# Altium schematic symbol library 13-Analog D 数模模数.SchLib: 573 symbols (part 2 of 6)
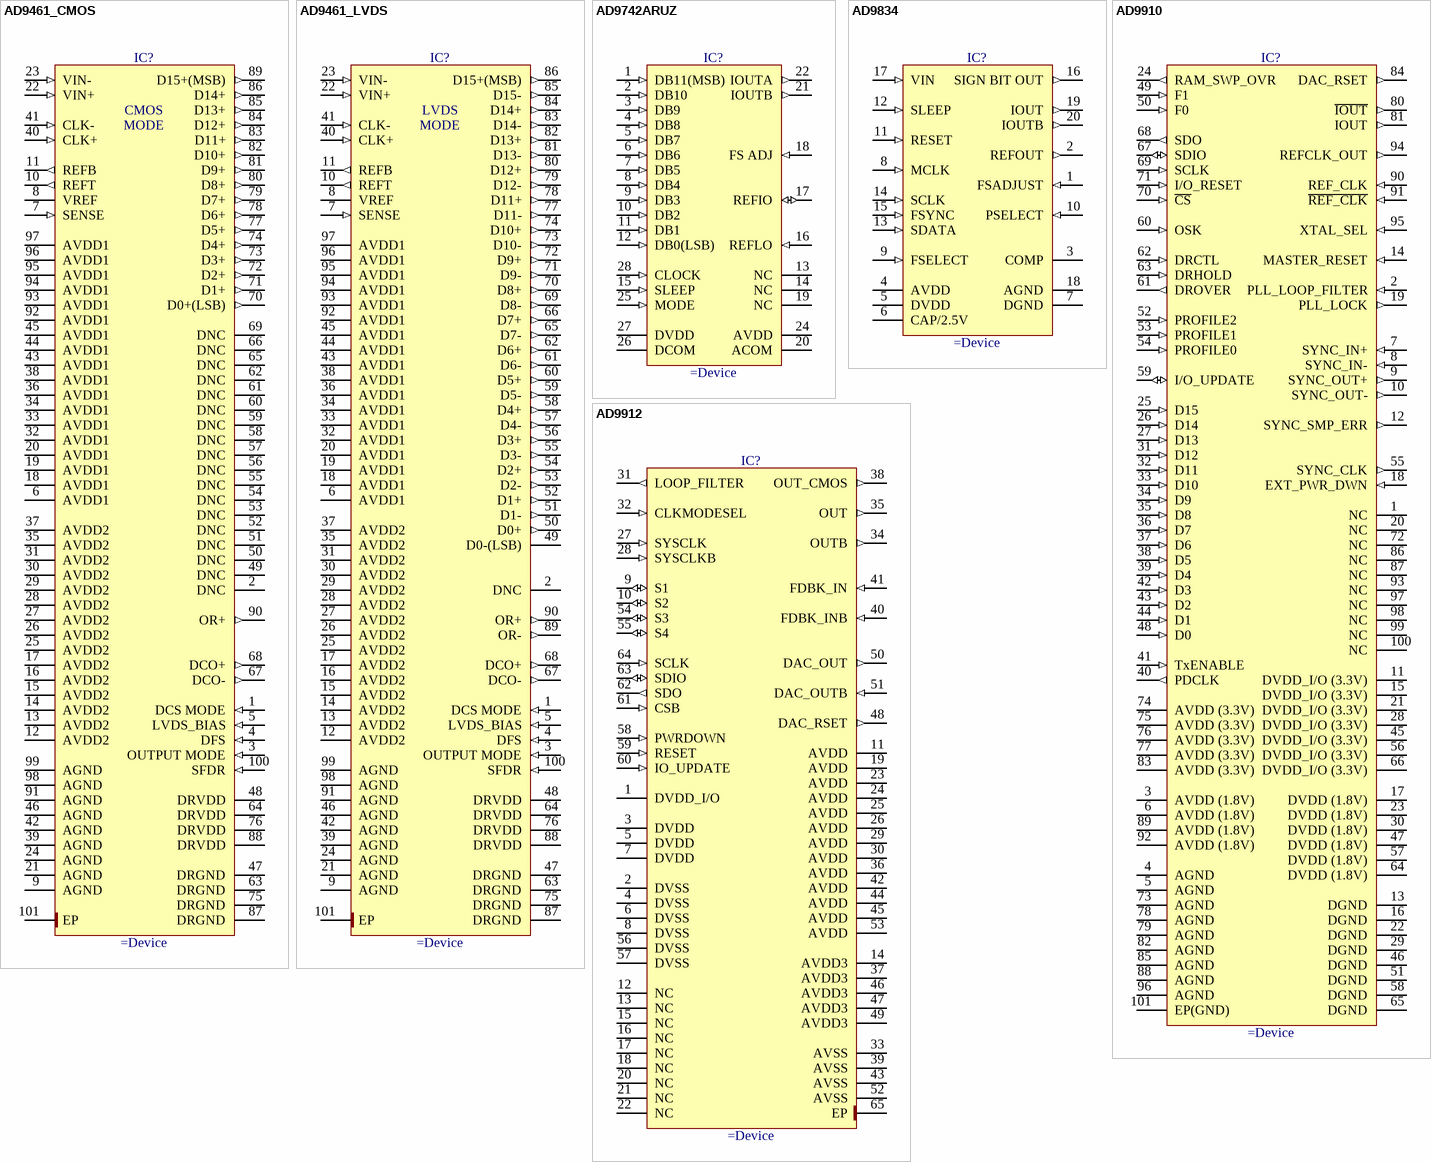
[diagram p41: symbols AD9461_CMOS to AD9912]

## AD9461_LVDS
designator IC?
16-Bit, 130 MSPS IF Sampling ADC (LVDS Mode)
pins: 1 DCS MODE (in), 2 DNC, 3 OUTPUT MODE (in), 4 DFS (in), 5 LVDS_BIAS (in), 6 AVDD1 (power), 7 SENSE (in), 8 VREF, 9 AGND (power), 10 REFT (out), 11 REFB (out), 12 AVDD2 (power), 13 AVDD2 (power), 14 AVDD2 (power), 15 AVDD2 (power), 16 AVDD2 (power), 17 AVDD2 (power), 18 AVDD1 (power), 19 AVDD1 (power), 20 AVDD1 (power), 21 AGND (power), 22 VIN+ (in), 23 VIN- (in), 24 AGND (power), 25 AVDD2 (power), 26 AVDD2 (power), 27 AVDD2 (power), 28 AVDD2 (power), 29 AVDD2 (power), 30 AVDD2 (power), 31 AVDD2 (power), 32 AVDD1 (power), 33 AVDD1 (power), 34 AVDD1 (power), 35 AVDD2 (power), 36 AVDD1 (power), 37 AVDD2 (power), 38 AVDD1 (power), 39 AGND (power), 40 CLK+ (in), 41 CLK- (in), 42 AGND (power), 43 AVDD1 (power), 44 AVDD1 (power), 45 AVDD1 (power), 46 AGND (power), 47 DRGND (power), 48 DRVDD (power), 49 D0-(LSB) (power), 50 D0+ (out), 51 D1- (out), 52 D1+ (out), 53 D2- (out), 54 D2+ (out), 55 D3- (out), 56 D3+ (out), 57 D4- (out), 58 D4+ (out), 59 D5- (out), 60 D5+ (out), 61 D6- (out), 62 D6+ (out), 63 DRGND (power), 64 DRVDD (power), 65 D7- (out), 66 D7+ (out), 67 DCO- (out), 68 DCO+ (out), 69 D8- (out), 70 D8+ (out), 71 D9- (out), 72 D9+ (out), 73 D10- (out), 74 D10+ (out), 75 DRGND (power), 76 DRVDD (power), 77 D11- (out), 78 D11+ (out), 79 D12- (out), 80 D12+ (out), 81 D13- (out), 82 D13+ (out), 83 D14- (out), 84 D14+ (out), 85 D15- (out), 86 D15+(MSB) (out), 87 DRGND (power), 88 DRVDD (power), 89 OR- (out), 90 OR+ (out), 91 AGND (power), 92 AVDD1 (power), 93 AVDD1 (power), 94 AVDD1 (power), 95 AVDD1 (power), 96 AVDD1 (power), 97 AVDD1 (power), 98 AGND (power), 99 AGND (power), 100 SFDR (in), 101 EP (power)
text: LVDS; MODE

## AD9742ARUZ
designator IC?
12-Bit, 210 MSPS TxDAC® D/A Converter
pins: 1 DB11(MSB) (in), 2 DB10 (in), 3 DB9 (in), 4 DB8 (in), 5 DB7 (in), 6 DB6 (in), 7 DB5 (in), 8 DB4 (in), 9 DB3 (in), 10 DB2 (in), 11 DB1 (in), 12 DB0(LSB) (in), 13 NC, 14 NC, 15 SLEEP (in), 16 REFLO (in), 17 REFIO (io), 18 FS ADJ (in), 19 NC, 20 ACOM (power), 21 IOUTB (out), 22 IOUTA (out), 24 AVDD (power), 25 MODE (in), 26 DCOM (power), 27 DVDD (power), 28 CLOCK (in)

## AD9834
designator IC?
20mW Power, 2.3V to 5.5V, 75MHz Complete DDS
pins: 1 FSADJUST (in) "Full-Scale Adjust Control. A resistor (RSET) is connected between this pin and AGND. This determines the magnitude of the full-scale DAC current. [see datasheet]", 2 REFOUT (out) "Voltage Reference Output. The AD9834 has an internal 1.20 V reference that is made available at this pin.", 3 COMP "DAC Bias Pin. This pin is used for decoupling the DAC bias voltage.", 4 AVDD (power) "Positive Power Supply for the Analog Section. AVDD can have a value from 2.3 V to 5.5 V. A 0.1 uF decoupling capacitor should be connected between AVDD and AGND.", 5 DVDD (power) "Positive Power Supply for the Digital Section. DVDD can have a value from 2.3 V to 5.5 V. A 0.1 uF decoupling capacitor should be connected between DVDD and DGND.", 6 CAP/2.5V (power) "The digital circuitry operates from a 2.5 V power supply. This 2.5 V is generated from DVDD using an on-board regulator (when DVDD exceeds 2.7 V). [see datasheet]", 7 DGND (power) "Digital Ground.", 8 MCLK (in) "Digital Clock Input. DDS output frequencies are expressed as a binary fraction of the frequency of MCLK. The output frequency accuracy and phase noise are determined by this clock.", 9 FSELECT (in) "Frequency Select Input. FSELECT controls which frequency register, FREQ0 or FREQ1, is used in the phase accumulator. The frequency register to be used can be selected using Pin FSELECT or Bit FSEL. [see datasheet]", 10 PSELECT (in) "Phase Select Input. PSELECT controls which phase register, PHASE0 or PHASE1, is added to the phase accumulator output. The phase register to be used can be selected using Pin PSELECT or Bit PSEL. [see datasheet]", 11 RESET (in) "Active High Digital Input. RESET resets appropriate internal registers to zero; this corresponds to an analog output of midscale. RESET does not affect any of the addressable registers.", 12 SLEEP (in) "Active High Digital Input. When this pin is high, the DAC is powered down. This pin has the same function as Control Bit SLEEP12.", 13 SDATA (in) "Serial Data Input. The 16-bit serial data-word is applied to this input.", 14 SCLK (in) "Serial Clock Input. Data is clocked into the AD9834 on each falling SCLK edge.", 15 FSYNC (in) "Active Low Control Input. This is the frame synchronization signal for the input data. When FSYNC is taken low, the internal logic is informed that a new word is being loaded into the device.", 16 SIGN BIT OUT (out) "Logic Output. The comparator output is available on this pin or, alternatively, the MSB from the NCO can be output on this pin. Setting Bit OPBITEN in the control register to 1 enables this output pin. [see datasheet]", 17 VIN (in) "Input to Comparator. The comparator can be used to generate a square wave from the sinusoidal DAC output. The DAC output should be filtered appropriately before being applied to the comparator to improve jitter. [see datasheet]", 18 AGND (power) "Analog Ground.", 19 IOUT (out) "Current Output. This is a high impedance current source. A load resistor of nominally 200  ohm should be connected between IOUT and AGND. [see datasheet]", 20 IOUTB (out) "Current Output. This is a high impedance current source. A load resistor of nominally 200  ohm should be connected between IOUT and AGND. [see datasheet]"

## AD9910
designator IC?
1 GSPS, 14-Bit, 3.3 V CMOS Direct Digital Synthesizer
pins: 1 NC, 2 PLL_LOOP_FILTER (in), 3 AVDD (1.8V) (power), 4 AGND (power), 5 AGND (power), 6 AVDD (1.8V) (power), 7 SYNC_IN+ (in), 8 SYNC_IN- (in), 9 SYNC_OUT+ (out), 10 SYNC_OUT- (out), 11 DVDD_I/O (3.3V) (power), 12 SYNC_SMP_ERR (out), 13 DGND (power), 14 MASTER_RESET (in), 15 DVDD_I/O (3.3V) (power), 16 DGND (power), 17 DVDD (1.8V) (power), 18 EXT_PWR_DWN (in), 19 PLL_LOCK (out), 20 NC, 21 DVDD_I/O (3.3V) (power), 22 DGND (power), 23 DVDD (1.8V) (power), 24 RAM_SWP_OVR (out), 25 D15 (in), 26 D14 (in), 27 D13 (in), 28 DVDD_I/O (3.3V) (power), 29 DGND (power), 30 DVDD (1.8V) (power), 31 D12 (in), 32 D11 (in), 33 D10 (in), 34 D9 (in), 35 D8 (in), 36 D7 (in), 37 D6 (in), 38 D5 (in), 39 D4 (in), 40 PDCLK (out), 41 TxENABLE (in), 42 D3 (in), 43 D2 (in), 44 D1 (in), 45 DVDD_I/O (3.3V) (power), 46 DGND (power), 47 DVDD (1.8V) (power), 48 D0 (in), 49 F1 (in), 50 F0 (in), 51 DGND (power), 52 PROFILE2 (in), 53 PROFILE1 (in), 54 PROFILE0 (in), 55 SYNC_CLK (out), 56 DVDD_I/O (3.3V) (power), 57 DVDD (1.8V) (power), 58 DGND (power), 59 I/O_UPDATE (io), 60 OSK (in), 61 DROVER (out), 62 DRCTL (in), 63 DRHOLD (in), 64 DVDD (1.8V) (power), 65 DGND (power), 66 DVDD_I/O (3.3V) (power), 67 SDIO (io), 68 SDO (out), 69 SCLK (in), 70 ~{CS} (in), 71 I/O_RESET (in), 72 NC, 73 AGND (power), 74 AVDD (3.3V) (power), 75 AVDD (3.3V) (power), 76 AVDD (3.3V) (power), 77 AVDD (3.3V) (power), 78 AGND (power), 79 AGND (power), 80 ~{IOUT} (out), 81 IOUT (out), 82 AGND (power), 83 AVDD (3.3V) (power), 84 DAC_RSET (out), 85 AGND (power), 86 NC, 87 NC, 88 AGND (power), 89 AVDD (1.8V) (power), 90 REF_CLK (in), 91 ~{REF_CLK} (in), 92 AVDD (1.8V) (power), 93 NC, 94 REFCLK_OUT (out), 95 XTAL_SEL (in), 96 AGND (power), 97 NC, 98 NC, 99 NC, 100 NC, 101 EP(GND) (power)

## AD9912
designator IC?
1 GSPS Direct Digital Synthetizer with 14-Bit DAC
pins: 1 DVDD_I/O (power), 2 DVSS (power), 3 DVDD (power), 4 DVSS (power), 5 DVDD (power), 6 DVSS (power), 7 DVDD (power), 8 DVSS (power), 9 S1 (io), 10 S2 (io), 11 AVDD (power), 12 NC, 13 NC, 14 AVDD3 (power), 15 NC, 16 NC, 17 NC, 18 NC, 19 AVDD (power), 20 NC, 21 NC, 22 NC, 23 AVDD (power), 24 AVDD (power), 25 AVDD (power), 26 AVDD (power), 27 SYSCLK (in), 28 SYSCLKB (in), 29 AVDD (power), 30 AVDD (power), 31 LOOP_FILTER (out), 32 CLKMODESEL (in), 33 AVSS (power), 34 OUTB (out), 35 OUT (out), 36 AVDD (power), 37 AVDD3 (power), 38 OUT_CMOS (out), 39 AVSS (power), 40 FDBK_INB (in), 41 FDBK_IN (in), 42 AVDD (power), 43 AVSS (power), 44 AVDD (power), 45 AVDD (power), 46 AVDD3 (power), 47 AVDD3 (power), 48 DAC_RSET (out), 49 AVDD3 (power), 50 DAC_OUT (out), 51 DAC_OUTB (in), 52 AVSS (power), 53 AVDD (power), 54 S3 (io), 55 S4 (io), 56 DVSS (power), 57 DVSS (power), 58 PWRDOWN (in), 59 RESET (in), 60 IO_UPDATE (in), 61 CSB (in), 62 SDO (out), 63 SDIO (io), 64 SCLK (in), 65 EP (power)

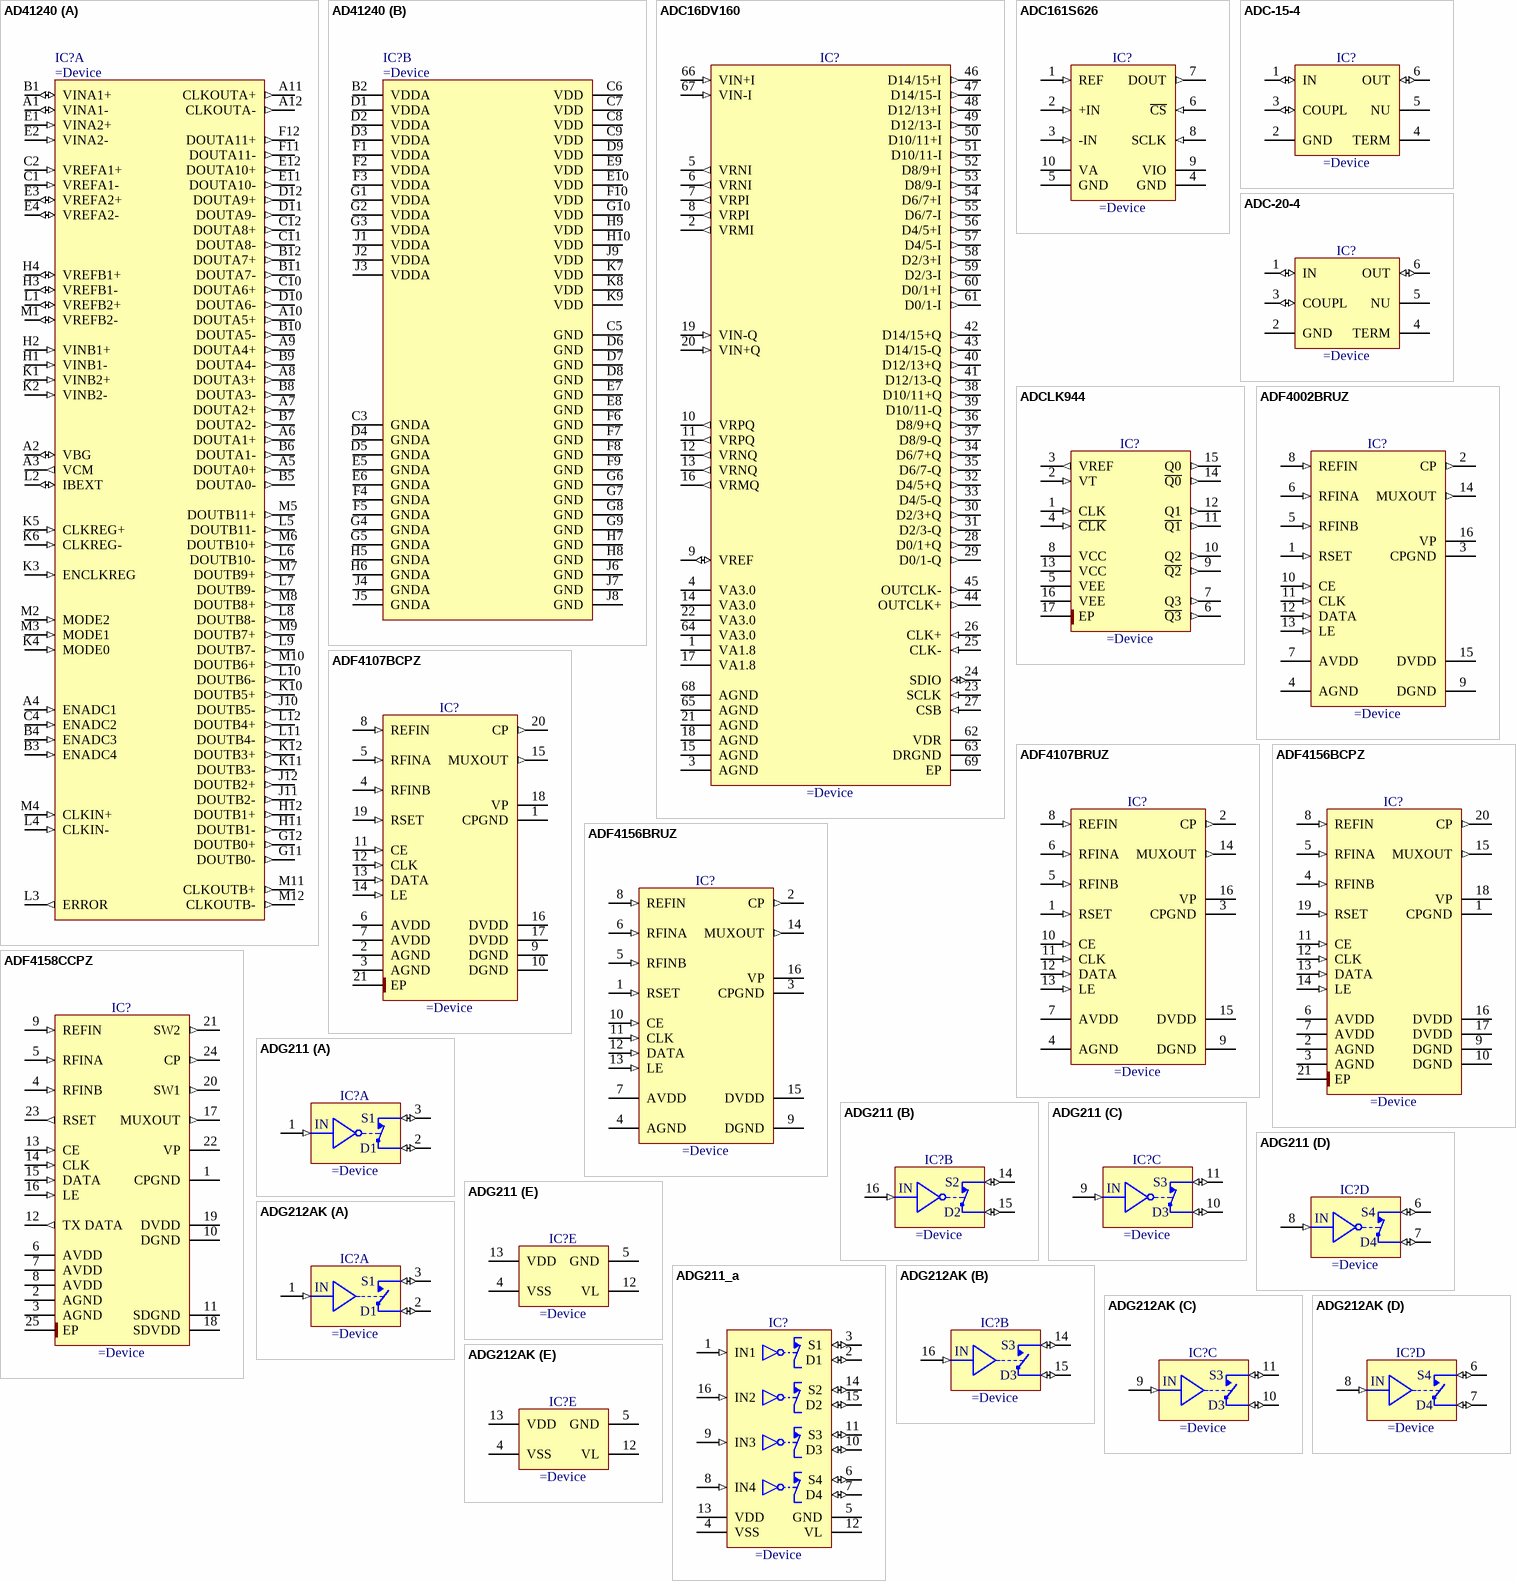
[diagram p8: symbols AD41240 to ADG212AK]

## AD41240
designator IC?
A CMOS Low Power, Quad Channel, 12 Bit, 40MS/S Pipelined ADC for Applications in Particle Physics Calorimetry
part A pins: A1 VINA1- (io), A2 VBG (io), A3 VCM (out), A4 ENADC1 (in), A5 DOUTA0+ (out), A6 DOUTA1+ (out), A7 DOUTA2+ (out), A8 DOUTA3+ (out), A9 DOUTA4+ (out), A10 DOUTA5+ (out), A11 CLKOUTA+ (out), A12 CLKOUTA- (out), B1 VINA1+ (io), B3 ENADC4 (in), B4 ENADC3 (in), B5 DOUTA0- (out), B6 DOUTA1- (out), B7 DOUTA2- (out), B8 DOUTA3- (out), B9 DOUTA4- (out), B10 DOUTA5- (out), B11 DOUTA7- (out), B12 DOUTA7+ (out), C1 VREFA1- (in), C2 VREFA1+ (in), C4 ENADC2 (in), C10 DOUTA6+ (out), C11 DOUTA8- (out), C12 DOUTA8+ (out), D10 DOUTA6- (out), D11 DOUTA9- (out), D12 DOUTA9+ (out), E1 VINA2+ (in), E2 VINA2- (in), E3 VREFA2+ (io), E4 VREFA2- (io), E11 DOUTA10- (out), E12 DOUTA10+ (out), F11 DOUTA11- (out), F12 DOUTA11+ (out), G11 DOUTB0- (out), G12 DOUTB0+ (out), H1 VINB1- (in), H2 VINB1+ (in), H3 VREFB1- (io), H4 VREFB1+ (io), H11 DOUTB1- (out), H12 DOUTB1+ (out), J10 DOUTB5- (out), J11 DOUTB2- (out), J12 DOUTB2+ (out), K1 VINB2+ (in), K2 VINB2- (in), K3 ENCLKREG (in), K4 MODE0 (in), K5 CLKREG+ (in), K6 CLKREG- (in), K10 DOUTB5+ (out), K11 DOUTB3- (out), K12 DOUTB3+ (out), L1 VREFB2+ (io), L2 IBEXT (io), L3 ERROR (out), L4 CLKIN- (in), L5 DOUTB11- (out), L6 DOUTB10- (out), L7 DOUTB9- (out), L8 DOUTB8- (out), L9 DOUTB7- (out), L10 DOUTB6- (out), L11 DOUTB4- (out), L12 DOUTB4+ (out), M1 VREFB2- (io), M2 MODE2 (in), M3 MODE1 (in), M4 CLKIN+ (in), M5 DOUTB11+ (out), M6 DOUTB10+ (out), M7 DOUTB9+ (out), M8 DOUTB8+ (out), M9 DOUTB7+ (out), M10 DOUTB6+ (out), M11 CLKOUTB+ (out), M12 CLKOUTB- (out)
part B pins: B2 VDDA (power), C3 GNDA (power), C5 GND (power), C6 VDD (power), C7 VDD (power), C8 VDD (power), C9 VDD (power), D1 VDDA (power), D2 VDDA (power), D3 VDDA (power), D4 GNDA (power), D5 GNDA (power), D6 GND (power), D7 GND (power), D8 GND (power), D9 VDD (power), E5 GNDA (power), E6 GNDA (power), E7 GND (power), E8 GND (power), E9 VDD (power), E10 VDD (power), F1 VDDA (power), F2 VDDA (power), F3 VDDA (power), F4 GNDA (power), F5 GNDA (power), F6 GND (power), F7 GND (power), F8 GND (power), F9 GND (power), F10 VDD (power), G1 VDDA (power), G2 VDDA (power), G3 VDDA (power), G4 GNDA (power), G5 GNDA (power), G6 GND (power), G7 GND (power), G8 GND (power), G9 GND (power), G10 VDD (power), H5 GNDA (power), H6 GNDA (power), H7 GND (power), H8 GND (power), H9 VDD (power), H10 VDD (power), J1 VDDA (power), J2 VDDA (power), J3 VDDA (power), J4 GNDA (power), J5 GNDA (power), J6 GND (power), J7 GND (power), J8 GND (power), J9 VDD (power), K7 VDD (power), K8 VDD (power), K9 VDD (power)

## ADC16DV160
designator IC?
Dual Channel, 16-Bit, 160 MSPS Analog-to-Digital Converter with DDR LVDS Outputs
pins: 1 VA1.8 (power), 2 VRMI (out), 3 AGND (power), 4 VA3.0 (power), 5 VRNI (out), 6 VRNI (out), 7 VRPI (out), 8 VRPI (out), 9 VREF (io), 10 VRPQ (out), 11 VRPQ (out), 12 VRNQ (out), 13 VRNQ (out), 14 VA3.0 (power), 15 AGND (power), 16 VRMQ (out), 17 VA1.8 (power), 18 AGND (power), 19 VIN-Q (in), 20 VIN+Q (in), 21 AGND (power), 22 VA3.0 (power), 23 SCLK (in), 24 SDIO (io), 25 CLK- (in), 26 CLK+ (in), 27 CSB (in), 28 D0/1+Q (out), 29 D0/1-Q (out), 30 D2/3+Q (out), 31 D2/3-Q (out), 32 D4/5+Q (out), 33 D4/5-Q (out), 34 D6/7+Q (out), 35 D6/7-Q (out), 36 D8/9+Q (out), 37 D8/9-Q (out), 38 D10/11+Q (out), 39 D10/11-Q (out), 40 D12/13+Q (out), 41 D12/13-Q (out), 42 D14/15+Q (out), 43 D14/15-Q (out), 44 OUTCLK+ (out), 45 OUTCLK- (out), 46 D14/15+I (out), 47 D14/15-I (out), 48 D12/13+I (out), 49 D12/13-I (out), 50 D10/11+I (out), 51 D10/11-I (out), 52 D8/9+I (out), 53 D8/9-I (out), 54 D6/7+I (out), 55 D6/7-I (out), 56 D4/5+I (out), 57 D4/5-I (out), 58 D2/3+I (out), 59 D2/3-I (out), 60 D0/1+I (out), 61 D0/1-I (out), 62 VDR (power), 63 DRGND (power), 64 VA3.0 (power), 65 AGND (power), 66 VIN+I (in), 67 VIN-I (in), 68 AGND (power), 69 EP (power)

## ADC161S626
designator IC?
16-Bit, 50 to 250 kSPS, Differential Input, MicroPower ADC
pins: 1 REF (in) "Voltage Reference", 2 +IN (in) "Non-Inverting Input", 3 -IN (in) "Inverting Input", 4 GND (power) "Ground", 5 GND (power) "Ground", 6 ~{CS} (in) "Chip Select Bar", 7 DOUT (out) "Serial Data Output", 8 SCLK (in) "Serial Clock", 9 VIO (power) "Digital Input/Output Power", 10 VA (power) "Analog Power"

## ADC-15-4
designator IC?
50 Ohm, 5 To 100MHz, Directional Coupler
pins: 1 IN (io), 2 GND (power), 3 COUPL (io), 4 TERM, 5 NU, 6 OUT (io)

## ADC-20-4
designator IC?
50 Ohm, 5 To 100MHz, Directional Coupler
pins: 1 IN (io), 2 GND (power), 3 COUPL (io), 4 TERM, 5 NU, 6 OUT (io)

## ADCLK944
designator IC?
2.5V/3.3V, Four LVPECL Outputs, SiGe Clock Fanout Buffer
pins: 1 CLK (in), 2 VT (in), 3 VREF (out), 4 ~{CLK} (in), 5 VEE (power), 6 ~{Q3} (out), 7 Q3 (out), 8 VCC (power), 9 ~{Q2} (out), 10 Q2 (out), 11 ~{Q1} (out), 12 Q1 (out), 13 VCC (power), 14 ~{Q0} (out), 15 Q0 (out), 16 VEE (power), 17 EP (power)

## ADF4002BRUZ
designator IC?
Phase Detector/Frequency Synthesizer
pins: 1 RSET (in), 2 CP (out), 3 CPGND (power), 4 AGND (power), 5 RFINB (in), 6 RFINA (in), 7 AVDD (power), 8 REFIN (in), 9 DGND (power), 10 CE (in), 11 CLK (in), 12 DATA (in), 13 LE (in), 14 MUXOUT (out), 15 DVDD (power), 16 VP (power)

## ADF4107BCPZ
designator IC?
PLL Frequency Synthesizer
pins: 1 CPGND (power), 2 AGND (power), 3 AGND (power), 4 RFINB (in), 5 RFINA (in), 6 AVDD (power), 7 AVDD (power), 8 REFIN (in), 9 DGND (power), 10 DGND (power), 11 CE (in), 12 CLK (in), 13 DATA (in), 14 LE (in), 15 MUXOUT (out), 16 DVDD (power), 17 DVDD (power), 18 VP (power), 19 RSET (in), 20 CP (out), 21 EP (power)

## ADF4107BRUZ
designator IC?
PLL Frequency Synthesizer
pins: 1 RSET (in), 2 CP (out), 3 CPGND (power), 4 AGND (power), 5 RFINB (in), 6 RFINA (in), 7 AVDD (power), 8 REFIN (in), 9 DGND (power), 10 CE (in), 11 CLK (in), 12 DATA (in), 13 LE (in), 14 MUXOUT (out), 15 DVDD (power), 16 VP (power)

## ADF4156BCPZ
designator IC?
6.2 GHz Fractional-N Frequency Synthesizer
pins: 1 CPGND (power), 2 AGND (power), 3 AGND (power), 4 RFINB (in), 5 RFINA (in), 6 AVDD (power), 7 AVDD (power), 8 REFIN (in), 9 DGND (power), 10 DGND (power), 11 CE (in), 12 CLK (in), 13 DATA (in), 14 LE (in), 15 MUXOUT (out), 16 DVDD (power), 17 DVDD (power), 18 VP (power), 19 RSET (in), 20 CP (out), 21 EP (power)

## ADF4156BRUZ
designator IC?
6.2 GHz Fractional-N Frequency Synthesizer
pins: 1 RSET (in), 2 CP (out), 3 CPGND (power), 4 AGND (power), 5 RFINB (in), 6 RFINA (in), 7 AVDD (power), 8 REFIN (in), 9 DGND (power), 10 CE (in), 11 CLK (in), 12 DATA (in), 13 LE (in), 14 MUXOUT (out), 15 DVDD (power), 16 VP (power)

## ADF4158CCPZ
designator IC?
Direct Modulation/Waveform Generating, 6.1 GHz Fractional-N Frequency Synthesizer
pins: 1 CPGND (power), 2 AGND (power), 3 AGND (power), 4 RFINB (in), 5 RFINA (in), 6 AVDD (power), 7 AVDD (power), 8 AVDD (power), 9 REFIN (in), 10 DGND (power), 11 SDGND (power), 12 TX DATA (out), 13 CE (in), 14 CLK (in), 15 DATA (in), 16 LE (in), 17 MUXOUT (out), 18 SDVDD (power), 19 DVDD (power), 20 SW1 (out), 21 SW2 (out), 22 VP (power), 23 RSET (out), 24 CP (out), 25 EP (power)

## ADG211
designator IC?
LC2MOS Quad SPST Switches
part A pins: 1 IN (in), 2 D (io), 3 S (io)
part B pins: 14 S (io), 15 D (io), 16 IN (in)
part C pins: 9 IN (in), 10 D (io), 11 S (io)
part D pins: 6 S (io), 7 D (io), 8 IN (in)
part E pins: 4 VSS (power), 5 GND (power), 12 VL (power), 13 VDD (power)
part A text: S1; D1
part B text: S2; D2
part C text: S3; D3
part D text: S4; D4

## ADG211_a
designator IC?
LC2MOS Quad SPST Switches
pins: 1 IN1 (in), 2 D1 (io), 3 S1 (io), 4 VSS (power), 5 GND (power), 6 S4 (io), 7 D4 (io), 8 IN4 (in), 9 IN3 (in), 10 D3 (io), 11 S3 (io), 12 VL (power), 13 VDD (power), 14 S2 (io), 15 D2 (io), 16 IN2 (in)

## ADG212AK
designator IC?
LC2MOS Quad Normaly Close SPST Switches
part A pins: 1 IN (in), 2 D (io), 3 S (io)
part B pins: 14 S (io), 15 D (io), 16 IN (in)
part C pins: 9 IN (in), 10 D (io), 11 S (io)
part D pins: 6 S (io), 7 D (io), 8 IN (in)
part E pins: 4 VSS (power), 5 GND (power), 12 VL (power), 13 VDD (power)
part A text: S1; D1
part B text: S3; D3
part C text: S3; D3
part D text: S4; D4

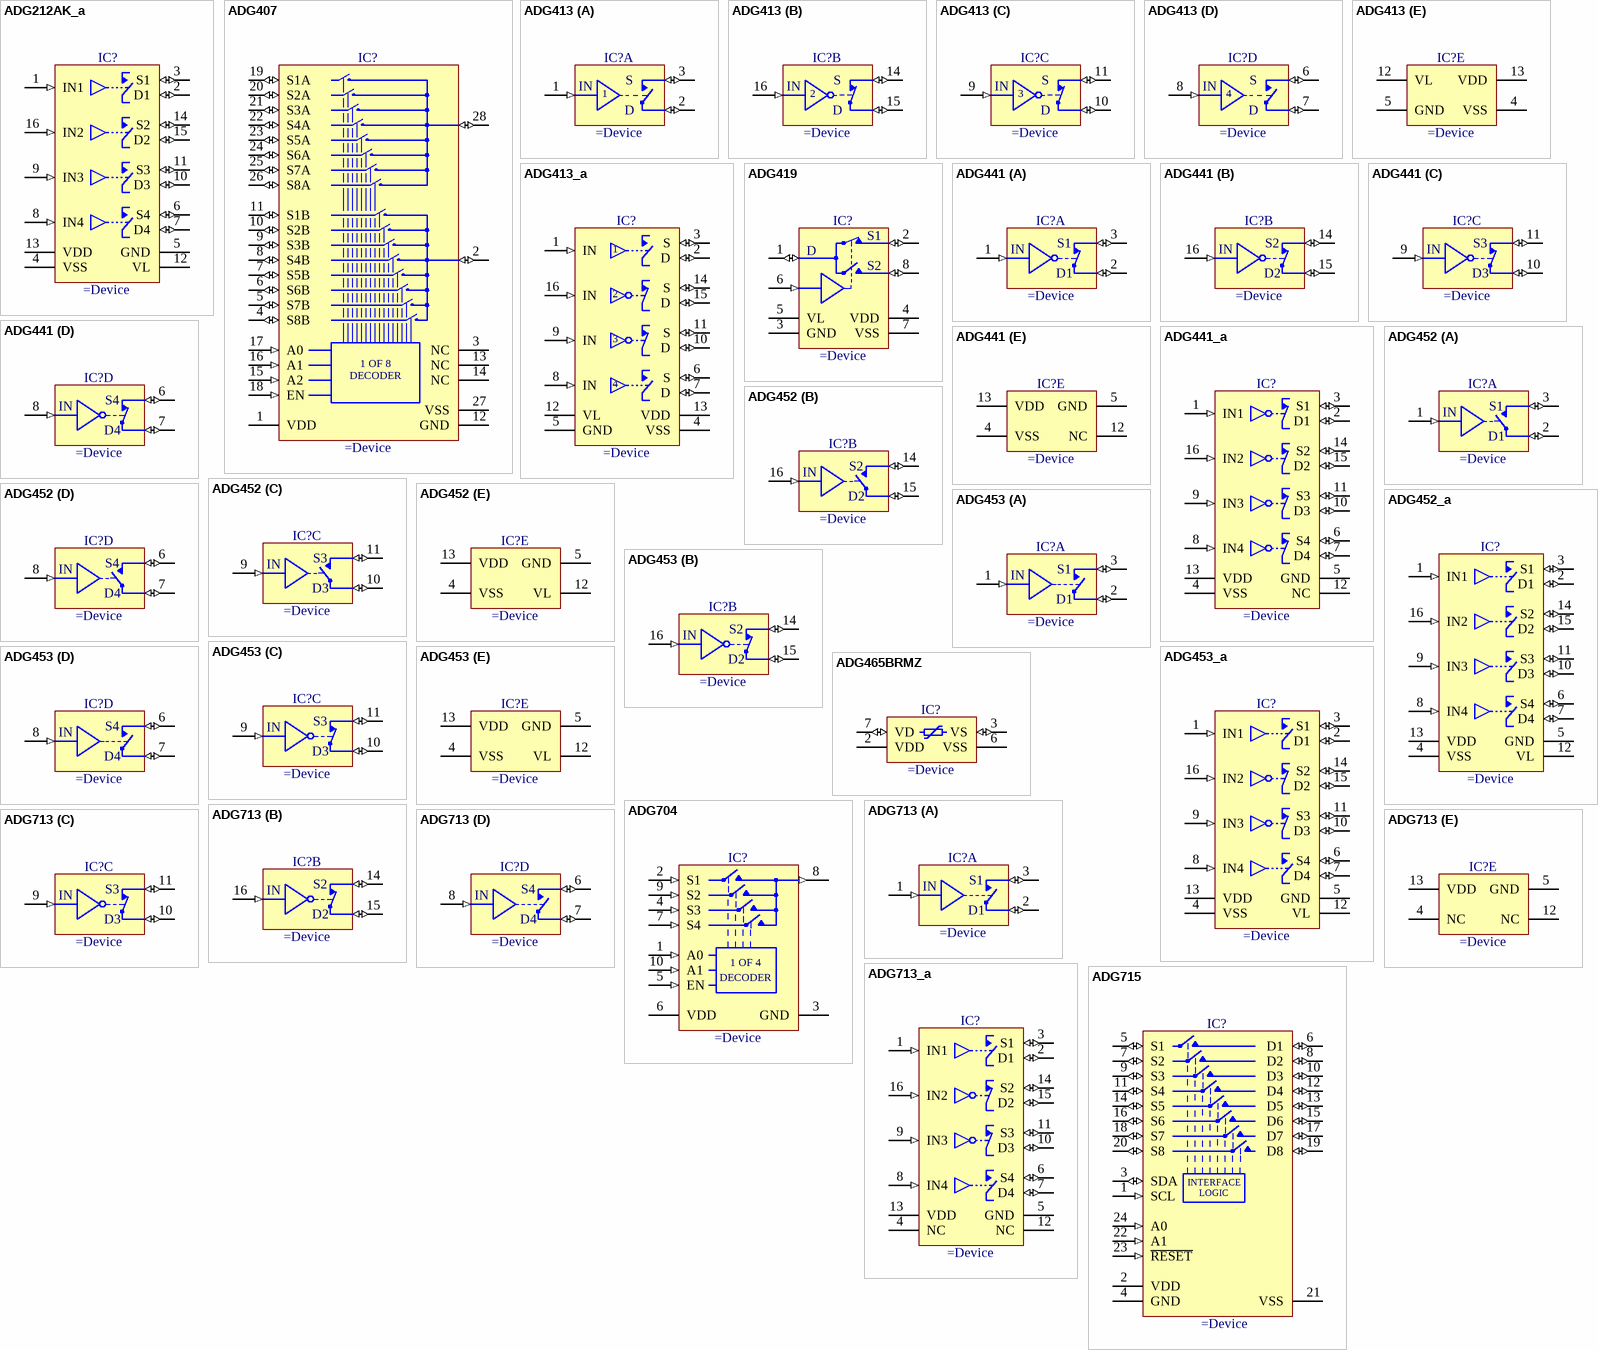
[diagram p9: symbols ADG212AK_a to ADG715]

## ADG212AK_a
designator IC?
LC2MOS Quad Normaly Close SPST Switches
pins: 1 IN1 (in), 2 D1 (io), 3 S1 (io), 4 VSS (power), 5 GND (power), 6 S4 (io), 7 D4 (io), 8 IN4 (in), 9 IN3 (in), 10 D3 (io), 11 S3 (io), 12 VL (power), 13 VDD (power), 14 S2 (io), 15 D2 (io), 16 IN2 (in)

## ADG407
designator IC?
LC2MOS ± 15 V, Dual 8 Channel, High Performance Analog Multiplexer
pins: 1 VDD (power), 2 DB (io), 3 NC, 4 S8B (io), 5 S7B (io), 6 S6B (io), 7 S5B (io), 8 S4B (io), 9 S3B (io), 10 S2B (io), 11 S1B (io), 12 GND (power), 13 NC, 14 NC, 15 A2 (in), 16 A1 (in), 17 A0 (in), 18 EN (in), 19 S1A (io), 20 S2A (io), 21 S3A (io), 22 S4A (io), 23 S5A (io), 24 S6A (io), 25 S7A (io), 26 S8A (io), 27 VSS (power), 28 DA (io)
text: 1 OF 8; DECODER

## ADG413
designator IC?
Precision Quad SPST Switches (2 Normally Open + 2 Normally Close)
part A pins: 1 IN (in), 2 D (io), 3 S (io)
part B pins: 14 S (io), 15 D (io), 16 IN (in)
part C pins: 9 IN (in), 10 D3 (io), 11 S3 (io)
part D pins: 6 S4 (io), 7 D4 (io), 8 IN (in)
part E pins: 4 VSS (power), 5 GND (power), 12 VL (power), 13 VDD (power)

## ADG413_a
designator IC?
Precision Quad SPST Switches (2 Normally Open + 2 Normally Close)
pins: 1 IN (in), 2 D (io), 3 S (io), 4 VSS (power), 5 GND (power), 6 S (io), 7 D (io), 8 IN (in), 9 IN (in), 10 D (io), 11 S (io), 12 VL (power), 13 VDD (power), 14 S (io), 15 D (io), 16 IN (in)

## ADG419
designator IC?
LC2MOS Precision SPDT Analog Switches
pins: 1 D (io), 2 S1 (io), 3 GND (power), 4 VDD (power), 5 VL (power), 6 IN (in), 7 VSS (power), 8 S2 (io)

## ADG441
designator IC?
LC2MOS Quad SPST Switches
part A pins: 1 IN (in), 2 D (io), 3 S (io)
part B pins: 14 S (io), 15 D (io), 16 IN (in)
part C pins: 9 IN (in), 10 D (io), 11 S (io)
part D pins: 6 S (io), 7 D (io), 8 IN (in)
part E pins: 4 VSS (power), 5 GND (power), 12 NC, 13 VDD (power)
part A text: S1; D1
part B text: S2; D2
part C text: S3; D3
part D text: S4; D4

## ADG441_a
designator IC?
LC2MOS Quad SPST Switches
pins: 1 IN1 (in), 2 D1 (io), 3 S1 (io), 4 VSS (power), 5 GND (power), 6 S4 (io), 7 D4 (io), 8 IN4 (in), 9 IN3 (in), 10 D3 (io), 11 S3 (io), 12 NC, 13 VDD (power), 14 S2 (io), 15 D2 (io), 16 IN2 (in)

## ADG452
designator IC?
Quad SPST Switches
part A pins: 1 IN (in), 2 D (io), 3 S (io)
part B pins: 14 S (io), 15 D (io), 16 IN (in)
part C pins: 9 IN (in), 10 D (io), 11 S (io)
part D pins: 6 S (io), 7 D (io), 8 IN (in)
part E pins: 4 VSS (power), 5 GND (power), 12 VL (power), 13 VDD (power)
part A text: S1; D1
part B text: S2; D2
part C text: S3; D3
part D text: S4; D4

## ADG452_a
designator IC?
Quad SPST Switches
pins: 1 IN1 (in), 2 D1 (io), 3 S1 (io), 4 VSS (power), 5 GND (power), 6 S4 (io), 7 D4 (io), 8 IN4 (in), 9 IN3 (in), 10 D3 (io), 11 S3 (io), 12 VL (power), 13 VDD (power), 14 S2 (io), 15 D2 (io), 16 IN2 (in)

## ADG453
designator IC?
Quad SPST Switches
part A pins: 1 IN (in), 2 D (io), 3 S (io)
part B pins: 14 S (io), 15 D (io), 16 IN (in)
part C pins: 9 IN (in), 10 D (io), 11 S (io)
part D pins: 6 S (io), 7 D (io), 8 IN (in)
part E pins: 4 VSS (power), 5 GND (power), 12 VL (power), 13 VDD (power)
part A text: S1; D1
part B text: S2; D2
part C text: S3; D3
part D text: S4; D4

## ADG453_a
designator IC?
Quad SPST Switches
pins: 1 IN1 (in), 2 D1 (io), 3 S1 (io), 4 VSS (power), 5 GND (power), 6 S4 (io), 7 D4 (io), 8 IN4 (in), 9 IN3 (in), 10 D3 (io), 11 S3 (io), 12 VL (power), 13 VDD (power), 14 S2 (io), 15 D2 (io), 16 IN2 (in)

## ADG465BRMZ
designator IC?
Single Channel Protector
pins: 2 VDD (power), 3 VS (io), 6 VSS (power), 7 VD (io)

## ADG704
designator IC?
CMOS, Low Voltage 2.5 Ohm, 4-Channel Analog Multiplexer
pins: 1 A0 (in), 2 S1 (in), 3 GND (power), 4 S3 (in), 5 EN (in), 6 VDD (power), 7 S4 (in), 8 D (out), 9 S2 (in), 10 A1 (in)
text: 1 OF 4; DECODER

## ADG713
designator IC?
Quad SPST Switches
part A pins: 1 IN (in), 2 D (io), 3 S (io)
part B pins: 14 S (io), 15 D (io), 16 IN (in)
part C pins: 9 IN (in), 10 D (io), 11 S (io)
part D pins: 6 S (io), 7 D (io), 8 IN (in)
part E pins: 4 NC, 5 GND (power), 12 NC, 13 VDD (power)
part A text: S1; D1
part B text: S2; D2
part C text: S3; D3
part D text: S4; D4

## ADG713_a
designator IC?
Quad SPST Switches
pins: 1 IN1 (in), 2 D1 (io), 3 S1 (io), 4 NC, 5 GND (power), 6 S4 (io), 7 D4 (io), 8 IN4 (in), 9 IN3 (in), 10 D3 (io), 11 S3 (io), 12 NC, 13 VDD (power), 14 S2 (io), 15 D2 (io), 16 IN2 (in)

## ADG715
designator IC?
CMOS, Low Voltage I2C Serially Controlled, Octal SPST Switches
pins: 1 SCL (in), 2 VDD (power), 3 SDA (io), 4 GND (power), 5 S1 (io), 6 D1 (io), 7 S2 (io), 8 D2 (io), 9 S3 (io), 10 D3 (io), 11 S4 (io), 12 D4 (io), 13 D5 (io), 14 S5 (io), 15 D6 (io), 16 S6 (io), 17 D7 (io), 18 S7 (io), 19 D8 (io), 20 S8 (io), 21 VSS (power), 22 A1 (in), 23 ~{RESET} (in), 24 A0 (in)
text: INTERFACE; LOGIC

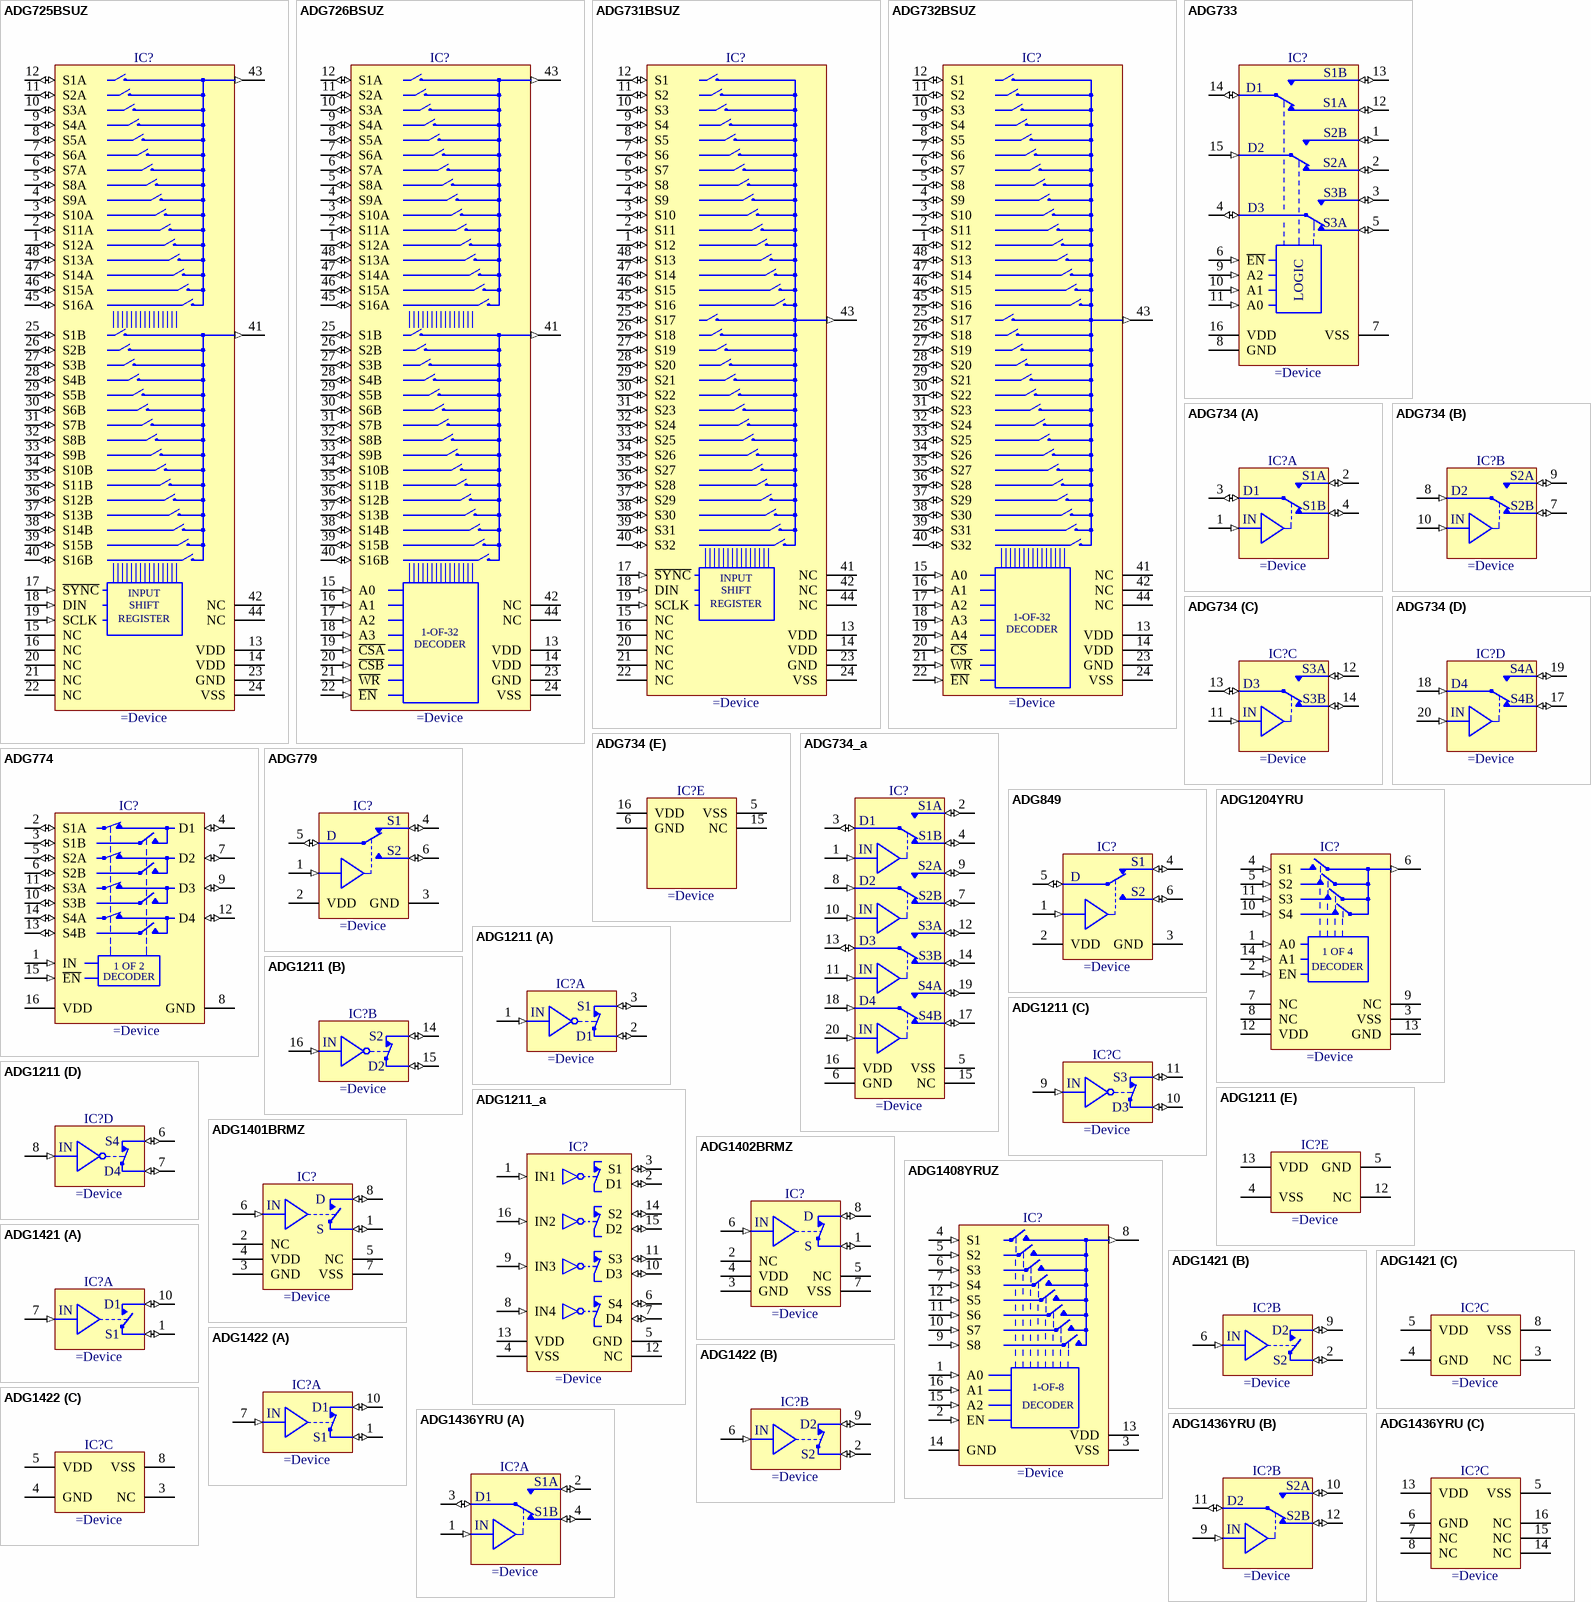
[diagram p10: symbols ADG725BSUZ to ADG1436YRU]

## ADG725BSUZ
designator IC?
Dual 16-Channel, Serially Controlled 4 Ohms +1.8V to +5.5V,  ±2.5V Analog Multiplexer
pins: 1 S12A (io), 2 S11A (io), 3 S10A (io), 4 S9A (io), 5 S8A (io), 6 S7A (io), 7 S6A (io), 8 S5A (io), 9 S4A (io), 10 S3A (io), 11 S2A (io), 12 S1A (io), 13 VDD (power), 14 VDD (power), 15 NC, 16 NC, 17 ~{SYNC} (in), 18 DIN (in), 19 SCLK (in), 20 NC, 21 NC, 22 NC, 23 GND (power), 24 VSS (power), 25 S1B (io), 26 S2B (io), 27 S3B (io), 28 S4B (io), 29 S5B (io), 30 S6B (io), 31 S7B (io), 32 S8B (io), 33 S9B (io), 34 S10B (io), 35 S11B (io), 36 S12B (io), 37 S13B (io), 38 S14B (io), 39 S15B (io), 40 S16B (io), 41 DB (out), 42 NC, 43 DA (out), 44 NC, 45 S16A (io), 46 S15A (io), 47 S14A (io), 48 S13A (io)
text: INPUT; SHIFT; REGISTER

## ADG726BSUZ
designator IC?
Dual 16-Channel, 4 Ohms +1.8V to +5.5V,  ±2.5V Analog Multiplexer
pins: 1 S12A (io), 2 S11A (io), 3 S10A (io), 4 S9A (io), 5 S8A (io), 6 S7A (io), 7 S6A (io), 8 S5A (io), 9 S4A (io), 10 S3A (io), 11 S2A (io), 12 S1A (io), 13 VDD (power), 14 VDD (power), 15 A0 (in), 16 A1 (in), 17 A2 (in), 18 A3 (in), 19 ~{CSA} (in), 20 ~{CSB} (in), 21 ~{WR} (in), 22 ~{EN} (in), 23 GND (power), 24 VSS (power), 25 S1B (io), 26 S2B (io), 27 S3B (io), 28 S4B (io), 29 S5B (io), 30 S6B (io), 31 S7B (io), 32 S8B (io), 33 S9B (io), 34 S10B (io), 35 S11B (io), 36 S12B (io), 37 S13B (io), 38 S14B (io), 39 S15B (io), 40 S16B (io), 41 DB (out), 42 NC, 43 DA (out), 44 NC, 45 S16A (io), 46 S15A (io), 47 S14A (io), 48 S13A (io)
text: 1-OF-32; DECODER

## ADG731BSUZ
designator IC?
32-Channel, Serially Controlled 4 Ohms +1.8V to +5.5V,  ±2.5V Analog Multiplexer
pins: 1 S12 (io), 2 S11 (io), 3 S10 (io), 4 S9 (io), 5 S8 (io), 6 S7 (io), 7 S6 (io), 8 S5 (io), 9 S4 (io), 10 S3 (io), 11 S2 (io), 12 S1 (io), 13 VDD (power), 14 VDD (power), 15 NC, 16 NC, 17 ~{SYNC} (in), 18 DIN (in), 19 SCLK (in), 20 NC, 21 NC, 22 NC, 23 GND (power), 24 VSS (power), 25 S17 (io), 26 S18 (io), 27 S19 (io), 28 S20 (io), 29 S21 (io), 30 S22 (io), 31 S23 (io), 32 S24 (io), 33 S25 (io), 34 S26 (io), 35 S27 (io), 36 S28 (io), 37 S29 (io), 38 S30 (io), 39 S31 (io), 40 S32 (io), 41 NC, 42 NC, 43 D (out), 44 NC, 45 S16 (io), 46 S15 (io), 47 S14 (io), 48 S13 (io)
text: INPUT; SHIFT; REGISTER

## ADG732BSUZ
designator IC?
32-Channel, 4 Ohms +1.8V to +5.5V,  ±2.5V Analog Multiplexer
pins: 1 S12 (io), 2 S11 (io), 3 S10 (io), 4 S9 (io), 5 S8 (io), 6 S7 (io), 7 S6 (io), 8 S5 (io), 9 S4 (io), 10 S3 (io), 11 S2 (io), 12 S1 (io), 13 VDD (power), 14 VDD (power), 15 A0 (in), 16 A1 (in), 17 A2 (in), 18 A3 (in), 19 A4 (in), 20 ~{CS} (in), 21 ~{WR} (in), 22 ~{EN} (in), 23 GND (power), 24 VSS (power), 25 S17 (io), 26 S18 (io), 27 S19 (io), 28 S20 (io), 29 S21 (io), 30 S22 (io), 31 S23 (io), 32 S24 (io), 33 S25 (io), 34 S26 (io), 35 S27 (io), 36 S28 (io), 37 S29 (io), 38 S30 (io), 39 S31 (io), 40 S32 (io), 41 NC, 42 NC, 43 D (out), 44 NC, 45 S16 (io), 46 S15 (io), 47 S14 (io), 48 S13 (io)
text: 1-OF-32; DECODER

## ADG733
designator IC?
CMOS, 2.5 Ohm Low Voltage, Triple SPDT Switch
pins: 1 S2B (io), 2 S2A (io), 3 S3B (io), 4 D3 (io), 5 S3A (io), 6 ~{EN} (in), 7 VSS (power), 8 GND (power), 9 A2 (in), 10 A1 (in), 11 A0 (in), 12 S1A (io), 13 S1B (io), 14 D1 (io), 15 D2 (in), 16 VDD (power)
text: LOGIC

## ADG734
designator IC?
CMOS, 2.5 Ohm Low Voltage, Quad SPDT Switch
part A pins: 1 IN (in), 2 S (io), 3 D (io), 4 S (io)
part B pins: 7 S (io), 8 D (in), 9 S (io), 10 IN (in)
part C pins: 11 IN (in), 12 S (io), 13 D (io), 14 S (io)
part D pins: 17 S (io), 18 D (in), 19 S (io), 20 IN (in)
part E pins: 5 VSS (power), 6 GND (power), 15 NC, 16 VDD (power)